# Altium footprint library Connector.PcbLib: 114 footprints (part 5 of 8)
Each footprint in its own frame and in the unit in brackets; x right, y up, seen from the top. Pads: shape width x height; smd on the part's side, far side on the other; paste and mask are expansions set on the pad; w line width, h text height; cw(c..) or ccw(c..) is an arc to the next point about the centre after c.
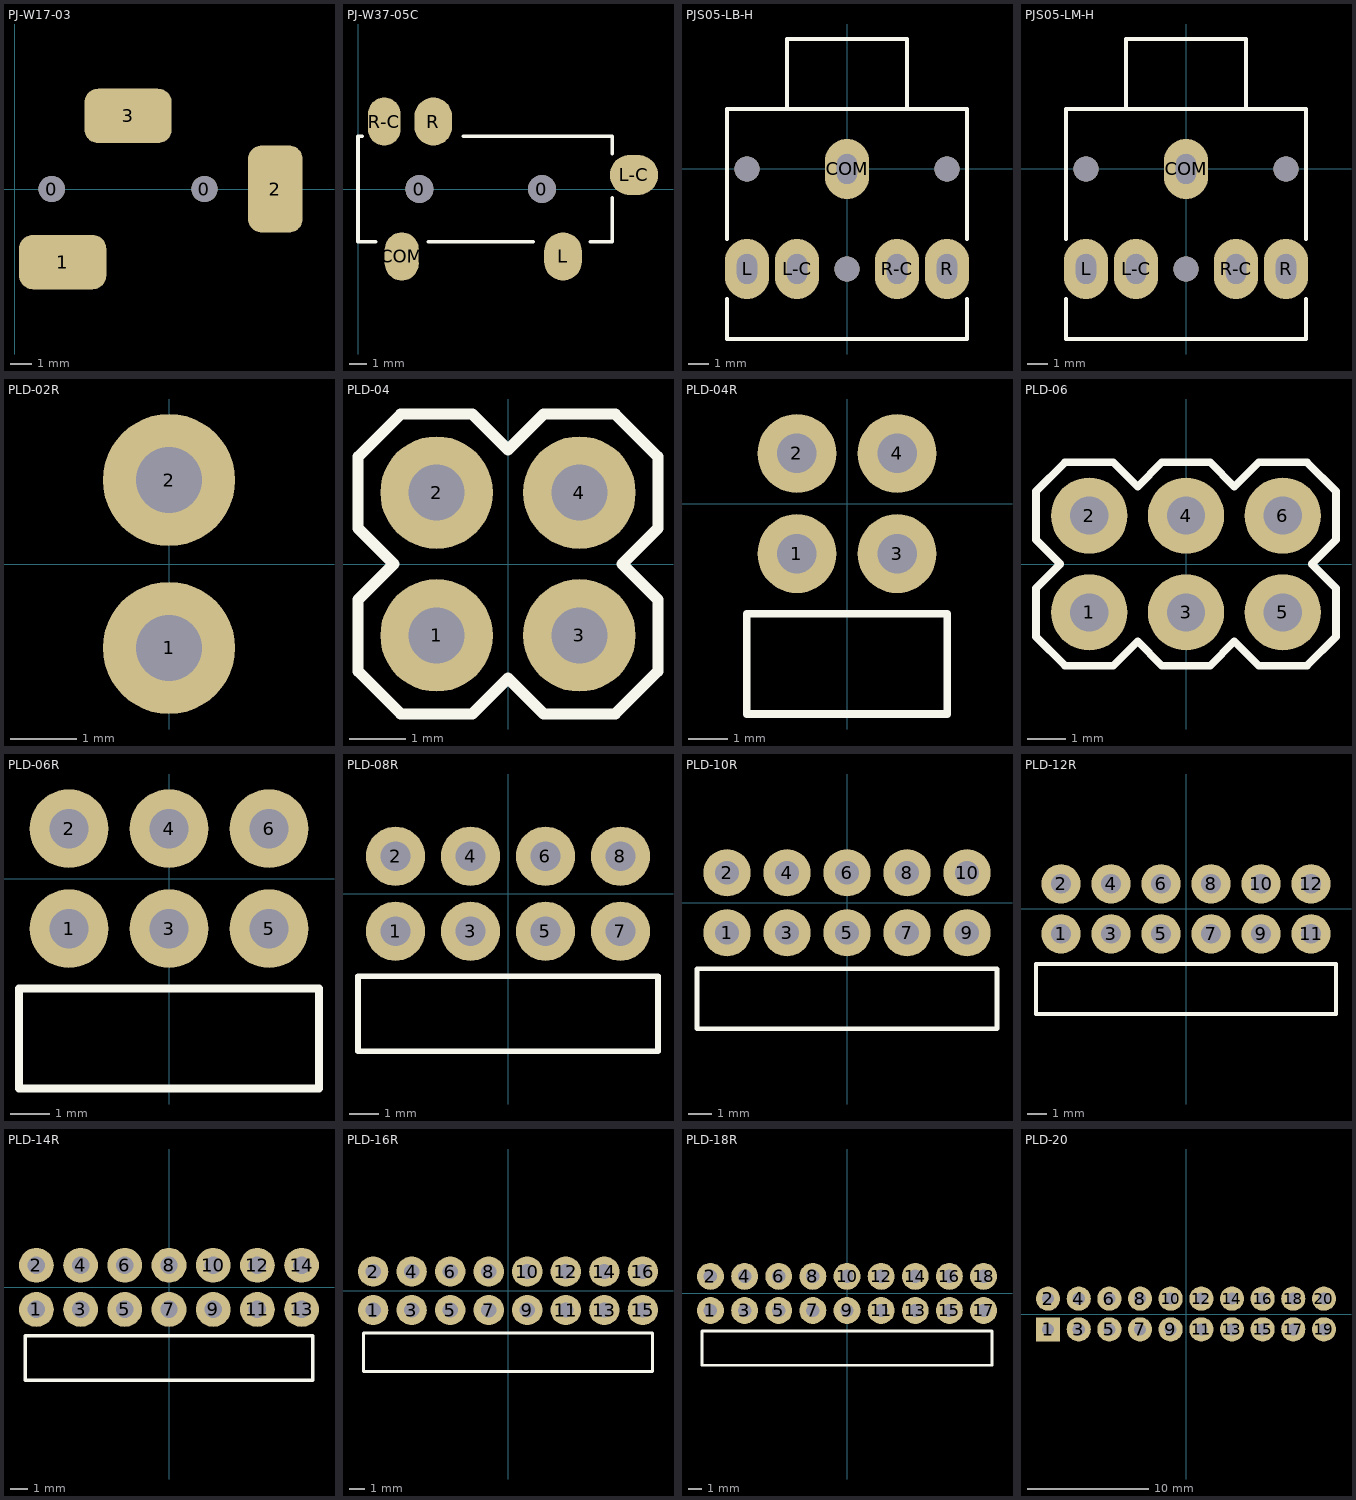
[diagram p4: the footprints below, top view; thin cyan lines are the x and y axes]

## PJ-W17-03 [mm]
pads (5):
  round 1.2 hole 1.2 unplated mask+0: 0(1.7,0) 0(8.7,0)
  rrect50% 4x2.5 smd mask+0.1: 1(2.2,-3.35) 3(5.2,3.35)
  rrect50% 2.5x4 smd mask+0.1: 2(11.95,0)
3D body "PJ-W17-03.STEP": height 5.12, standoff -0.88, extent -2.5,-2.8 11.5,2.8

## PJ-W37-05C [mm]
pads (7):
  round 1.6 hole 1.6 unplated: 0(3.5,0) 0(10.5,0)
  oval 1.95x2.75 smd: COM(2.5,-3.85)
  oval 2.15x2.75 smd: L(11.7,-3.85) R(4.3,3.85)
  oval 2.75x2.3 smd: L-C(15.75,0.8)
  oval 1.85x2.75 smd: R-C(1.5,3.85)
Top Overlay:
  lines w0.2: 0.25,3 0,3 0,-3 1,-3 ; 4,-3 10,-3 ; 6,3 14.5,3 14.5,2 ; 13.25,-3 14.5,-3 14.5,-0.5
3D body "PJ-W37-05C.STEP": height 5.02, standoff -0.78, extent -2.5,-4.25 16.5,4.25

## PJS05-LB-H [mm]
pads (8):
  oval 2.2x3 hole 1 slot 1.5 at 90 deg: COM(0,0) L(-5,-5) L-C(-2.5,-5) R(5,-5) R-C(2.5,-5)
  round 1.25 hole 1.25 unplated: ""(-5,0) ""(0,-5) ""(5,0)
Top Overlay:
  lines w0.2: -6,-6.5 -6,-8.5 6,-8.5 6,-6.5 ; -6,-3.5 -6,3 6,3 6,-3.5 ; -3,3 -3,6.5 3,6.5 3,3
3D body "PJS_05_LB_H.STEP": height 10.02, standoff -4.12, extent -6,-8.5 6,6.5

## PJS05-LM-H [mm]
pads (8):
  oval 2.2x3 hole 1 slot 1.5 at 90 deg: COM(0,0) L(-5,-5) L-C(-2.5,-5) R(5,-5) R-C(2.5,-5)
  round 1.25 hole 1.25 unplated: ""(-5,0) ""(0,-5) ""(5,0)
Top Overlay:
  lines w0.2: -6,-6.5 -6,-8.5 6,-8.5 6,-6.5 ; -6,-3.5 -6,3 6,3 6,-3.5 ; -3,3 -3,6.5 3,6.5 3,3
3D body "3_5mm_jack.STEP": height 10.02, standoff -4.12, extent -6,-8.5 6,6.5

## PLD-02R [mm]
pads (2):
  round 2 hole 1: 1(0,-1.27) 2(0,1.27)

## PLD-04 [mm]
pads (4):
  round 2 hole 1: 1(-1.27,-1.27) 2(-1.27,1.27) 3(1.27,-1.27) 4(1.27,1.27)
Top Overlay:
  lines w0.2: -2.667,-1.905 -2.667,-0.635 -2.032,0 -2.667,0.635 -2.667,1.905 -1.905,2.667 -0.635,2.667 0,2.032 0.635,2.667 1.905,2.667 2.667,1.905 2.667,0.635 2.032,0 2.667,-0.635 2.667,-1.905 1.905,-2.667 0.635,-2.667 0,-2.032 -0.635,-2.667 -1.905,-2.667 -2.667,-1.905
3D body "PLD-04.STEP": height 8.45, standoff -2.99, extent -2.54,-2.54 2.54,2.54

## PLD-04R [mm]
pads (4):
  round 2 hole 1: 1(-1.27,-1.27) 2(-1.27,1.27) 3(1.27,-1.27) 4(1.27,1.27)
Top Overlay:
  lines w0.2: -2.54,-5.334 2.54,-5.334 2.54,-2.794 -2.54,-2.794 -2.54,-5.334
3D body "PLD-04R.STEP": height 5.08, standoff -2.99, extent -2.54,-11.29 2.54,1.595

## PLD-06 [mm]
pads (6):
  round 2 hole 1: 1(-2.54,-1.27) 2(-2.54,1.27) 3(0,-1.27) 4(0,1.27) 5(2.54,-1.27) 6(2.54,1.27)
Top Overlay:
  lines w0.2: -3.937,-1.905 -3.175,-2.667 -1.905,-2.667 -1.27,-2.032 -0.635,-2.667 0.635,-2.667 1.27,-2.032 1.905,-2.667 3.175,-2.667 3.937,-1.905 3.937,-0.635 3.302,0 3.937,0.635 3.937,1.905 3.175,2.667 1.905,2.667 1.27,2.032 0.635,2.667 -0.635,2.667 -1.27,2.032 -1.905,2.667 -3.175,2.667 -3.937,1.905 -3.937,0.635 -3.302,0 -3.937,-0.635 -3.937,-1.905

## PLD-06R [mm]
pads (6):
  round 2 hole 1: 1(-2.54,-1.27) 2(-2.54,1.27) 3(0,-1.27) 4(0,1.27) 5(2.54,-1.27) 6(2.54,1.27)
Top Overlay:
  lines w0.2: -3.81,-5.334 -3.81,-2.794 3.81,-2.794 3.81,-5.334 -3.81,-5.334
3D body "PLD-06R.STEP": height 5.08, standoff -2.99, extent -3.81,-11.29 3.81,1.595

## PLD-08R [mm]
pads (8):
  round 2 hole 1: 1(-3.81,-1.27) 2(-3.81,1.27) 3(-1.27,-1.27) 4(-1.27,1.27) 5(1.27,-1.27) 6(1.27,1.27) 7(3.81,-1.27) 8(3.81,1.27)
Top Overlay:
  lines w0.2: -5.08,-5.334 -5.08,-2.794 5.08,-2.794 5.08,-5.334 -5.08,-5.334
3D body "PLD-08R.STEP": height 5.08, standoff -2.99, extent -5.08,-11.29 5.08,1.595

## PLD-10R [mm]
pads (10):
  round 2 hole 1: 1(-5.08,-1.27) 2(-5.08,1.27) 3(-2.54,-1.27) 4(-2.54,1.27) 5(0,-1.27) 6(0,1.27) 7(2.54,-1.27) 8(2.54,1.27) 9(5.08,-1.27) 10(5.08,1.27)
Top Overlay:
  lines w0.2: -6.35,-5.334 6.35,-5.334 6.35,-2.794 -6.35,-2.794 -6.35,-5.334
3D body "PLD-10R.STEP": height 5.08, standoff -2.99, extent -6.35,-11.29 6.35,1.595

## PLD-12R [mm]
pads (12):
  round 2 hole 1: 1(-6.35,-1.27) 2(-6.35,1.27) 3(-3.81,-1.27) 4(-3.81,1.27) 5(-1.27,-1.27) 6(-1.27,1.27) 7(1.27,-1.27) 8(1.27,1.27) 9(3.81,-1.27) 10(3.81,1.27) 11(6.35,-1.27) 12(6.35,1.27)
Top Overlay:
  lines w0.2: -7.62,-5.334 -7.62,-2.794 7.62,-2.794 7.62,-5.334 -7.62,-5.334
3D body "PLD-12R.STEP": height 5.08, standoff -2.99, extent -7.62,-11.29 7.62,1.595

## PLD-14R [mm]
pads (14):
  round 2 hole 1: 1(-7.62,-1.27) 2(-7.62,1.27) 3(-5.08,-1.27) 4(-5.08,1.27) 5(-2.54,-1.27) 6(-2.54,1.27) 7(0,-1.27) 8(0,1.27) 9(2.54,-1.27) 10(2.54,1.27) 11(5.08,-1.27) 12(5.08,1.27) 13(7.62,-1.27) 14(7.62,1.27)
Top Overlay:
  lines w0.2: -8.255,-5.334 8.255,-5.334 8.255,-2.794 -8.255,-2.794 -8.255,-5.334
3D body "PLD-14R.STEP": height 5.08, standoff -2.99, extent -8.89,-11.29 8.89,1.595

## PLD-16R [mm]
pads (16):
  round 2 hole 1: 1(-8.89,-1.27) 2(-8.89,1.27) 3(-6.35,-1.27) 4(-6.35,1.27) 5(-3.81,-1.27) 6(-3.81,1.27) 7(-1.27,-1.27) 8(-1.27,1.27) 9(1.27,-1.27) 10(1.27,1.27) 11(3.81,-1.27) 12(3.81,1.27) 13(6.35,-1.27) 14(6.35,1.27) 15(8.89,-1.27) 16(8.89,1.27)
Top Overlay:
  lines w0.2: -9.525,-5.334 -9.525,-2.794 9.525,-2.794 9.525,-5.334 -9.525,-5.334
3D body "PLD-16R.STEP": height 5.08, standoff -2.99, extent -10.16,-11.29 10.16,1.595

## PLD-18R [mm]
pads (18):
  round 2 hole 1: 1(-10.16,-1.27) 2(-10.16,1.27) 3(-7.62,-1.27) 4(-7.62,1.27) 5(-5.08,-1.27) 6(-5.08,1.27) 7(-2.54,-1.27) 8(-2.54,1.27) 9(0,-1.27) 10(0,1.27) 11(2.54,-1.27) 12(2.54,1.27) 13(5.08,-1.27) 14(5.08,1.27) 15(7.62,-1.27) 16(7.62,1.27) 17(10.16,-1.27) 18(10.16,1.27)
Top Overlay:
  lines w0.2: -10.795,-5.334 10.795,-5.334 10.795,-2.794 -10.795,-2.794 -10.795,-5.334

## PLD-20 [mm]
pads (20):
  rect 2x2 hole 1: 1(-11.43,-1.27)
  round 2 hole 1: 2(-11.43,1.27) 3(-8.89,-1.27) 4(-8.89,1.27) 5(-6.35,-1.27) 6(-6.35,1.27) 7(-3.81,-1.27) 8(-3.81,1.27) 9(-1.27,-1.27) 10(-1.27,1.27) 11(1.27,-1.27) 12(1.27,1.27) 13(3.81,-1.27) 14(3.81,1.27) 15(6.35,-1.27) 16(6.35,1.27) 17(8.89,-1.27) 18(8.89,1.27) 19(11.43,-1.27) 20(11.43,1.27)
3D body "PLD-xx.STEP": height 8.45, standoff -2.99, extent -12.7,-2.54 12.7,2.54